# Altium footprint library standard-graphic-logo.PcbLib: 61 footprints (part 1 of 4)
Each footprint in its own frame and in the unit in brackets; x right, y up, seen from the top. Pads: shape width x height; smd on the part's side, far side on the other; paste and mask are expansions set on the pad; w line width, h text height; cw(c..) or ccw(c..) is an arc to the next point about the centre after c.
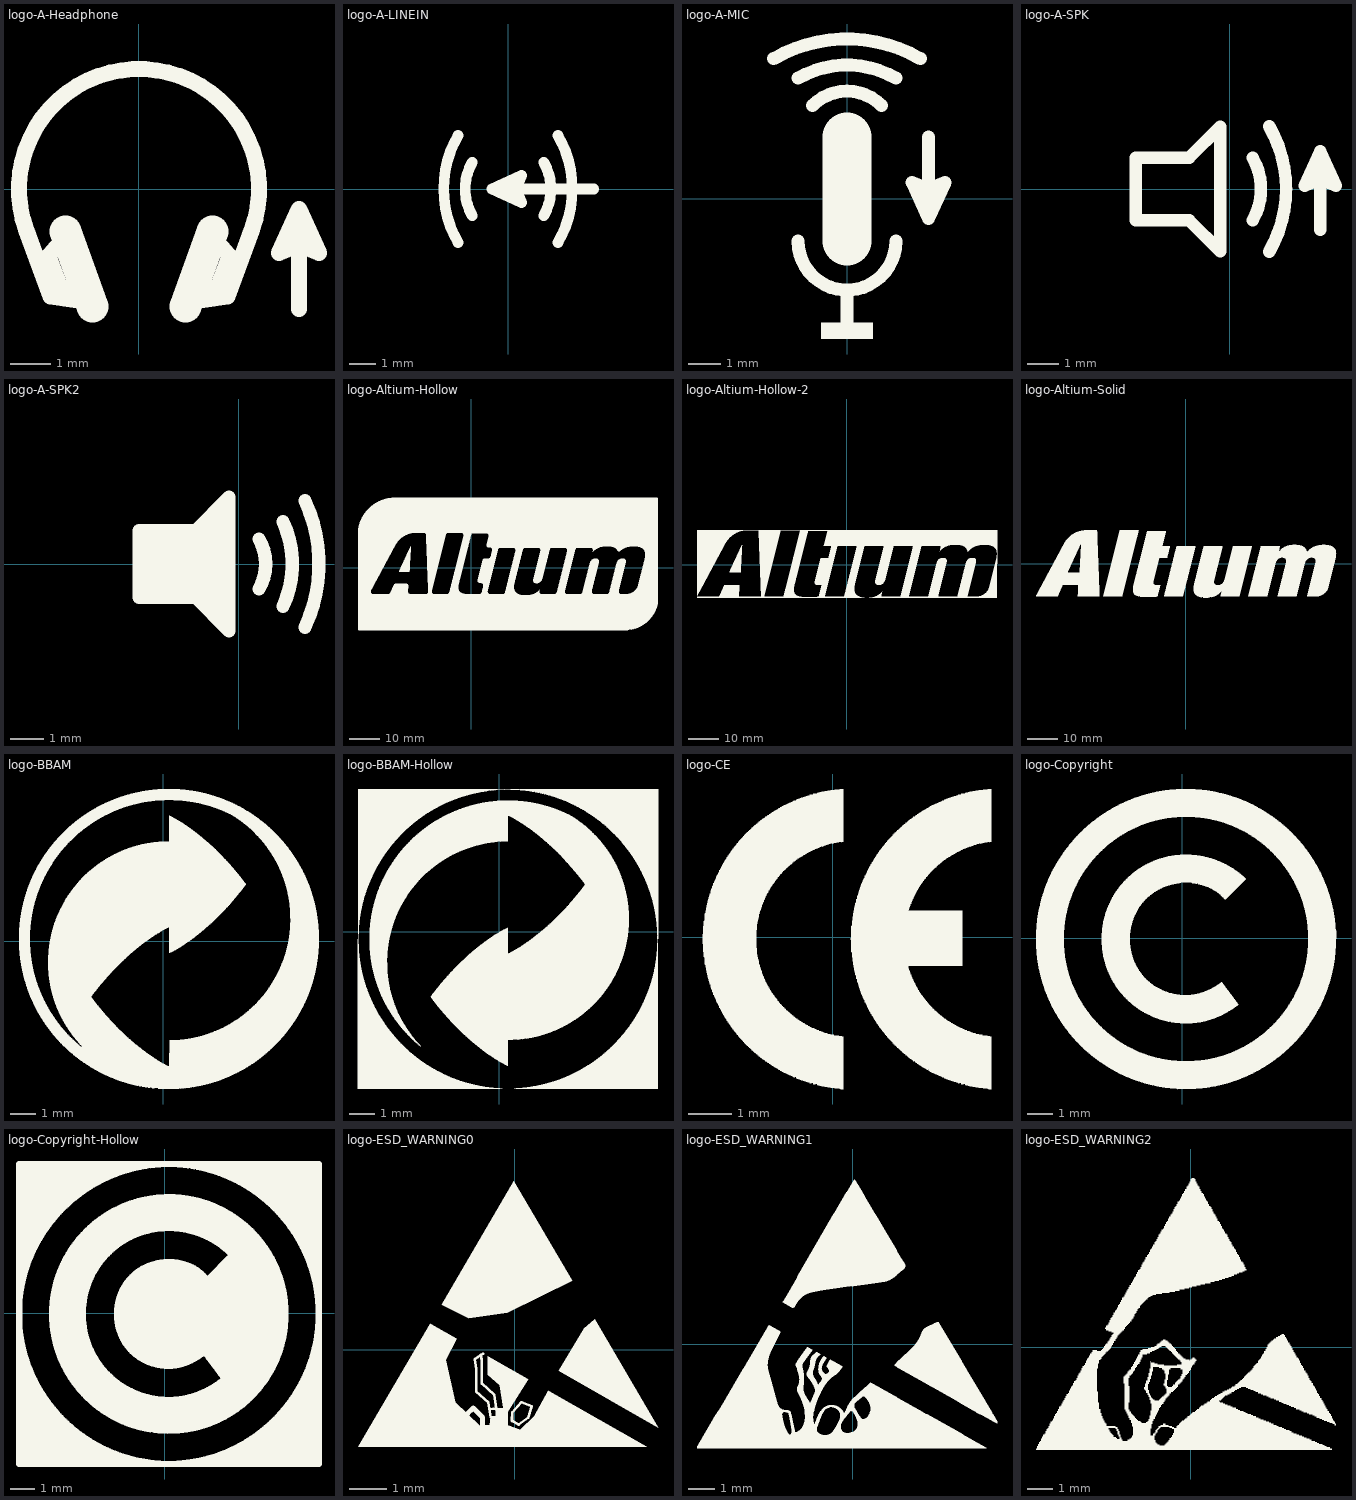
[diagram p0: the footprints below, top view; thin cyan lines are the x and y axes]

## logo-A-Headphone [mm]
Top Overlay:
  lines w0.4: -2.489,-1.934 -1.808,-1.154 ; -2.258,-1.67 -1.893,-2.675 ; -1.192,-2.846 -2.215,-2.686 -2.819,-1.026 cw(c0,0) 2.819,-1.026 2.215,-2.686 1.192,-2.846 ; 1.808,-1.154 2.489,-1.934 ; 1.893,-2.675 2.258,-1.67 ; 4,-3 4,-0.5 ; 4,-0.5 4.5,-1.6 4,-1.4 3.5,-1.6 4,-0.5
  lines w0.8: -1.842,-1.06 -1.158,-2.94 ; 1.158,-2.94 1.842,-1.06
  text "TarahiBoard.com" at 3.83,-1.417 h0.1

## logo-A-LINEIN [mm]
Top Overlay:
  lines w0.4: -1.864,-2 cw(c1.6,0) -1.864,2 ; -1.332,-1 cw(c0.4,0) -1.332,1 ; 1.332,-1 ccw(c-0.4,0) 1.332,1 ; 1.864,-2 ccw(c-1.6,0) 1.864,2 ; 3.2,0 -0.6,0 ; -0.6,0 0.5,-0.5 0.3,0 0.5,0.5 -0.6,0
  text "TarahiBoard.com" at 3.015,0.107 h0.1

## logo-A-MIC [mm]
Top Overlay:
  rectangle: -0.8,-4.3 0.8,-3.8
  lines w0.4: -2.25,4.297 cw(c0,0.4) 2.25,4.297 ; -1.5,-1.3 ccw(c0,-1.3) 1.5,-1.3 ; -1.5,3.698 cw(c0,1.1) 1.5,3.698 ; -1.061,2.861 cw(c0,1.8) 1.061,2.861 ; 0,-3.8 0,-2.8 ; 2.5,1.9 2.5,-0.6 ; 2.5,-0.6 3,0.5 2.5,0.3 2,0.5 2.5,-0.6
  lines w1.5: 0,-1.3 0,1.9
  text "TarahiBoard.com" at 0.107,-0.215 h0.1

## logo-A-SPK [mm]
Top Overlay:
  lines w0.4: 0.732,-1 ccw(c-1,0) 0.732,1 ; 1.264,-2 ccw(c-2.2,0) 1.264,2 ; 2.9,-1.3 2.9,1.2 ; 2.9,1.2 2.4,0.1 2.9,0.3 3.4,0.1 2.9,1.2 ; -3,-1 -3,1 -1.3,1 -0.3,2 -0.3,-2 -1.3,-1 -3,-1
  text "TarahiBoard.com" at -2.765,-1.107 h0.1

## logo-A-SPK2 [mm]
Top Overlay:
  region: -0.3,2 -1.3,1 -3,1 -3,-1 -1.3,-1 -0.3,-2
  lines w0.4: 0.599,-0.75 ccw(c-0.7,0) 0.599,0.75 ; 1.319,-1.268 ccw(c-1.4,0) 1.319,1.268 ; 1.978,-1.902 ccw(c-2.1,0) 1.978,1.902 ; -3,-1 -1.3,-1 -0.3,-2 -0.3,2 -1.3,1 -3,1 -3,-1
  text "TarahiBoard.com" at -2.52,0.02 h0.1

## logo-Altium-Hollow [mm]
Top Overlay:
  drawing of 2 lines, arcs and shapes, not listed
  text "TarahiBoard.com" at 35.193,14.632 h1

## logo-Altium-Hollow-2 [mm]
Top Overlay:
  drawing of 2 lines, arcs and shapes, not listed
  text "TarahiBoard.com" at 21.363,9.425 h1

## logo-Altium-Solid [mm]
Top Overlay:
  drawing of 6 lines, arcs and shapes, not listed
  text "TarahiBoard.com" at -21.998,7.253 h1

## logo-BBAM [mm]
Top Overlay:
  drawing of 1 lines, arcs and shapes, not listed

## logo-BBAM-Hollow [mm]
Top Overlay:
  drawing of 2 lines, arcs and shapes, not listed

## logo-CE [mm]
Top Overlay:
  drawing of 2 lines, arcs and shapes, not listed
  text "TarahiBoard.com" at 1.163,-0.107 h0.1

## logo-Copyright [mm]
Top Overlay:
  drawing of 2 lines, arcs and shapes, not listed

## logo-Copyright-Hollow [mm]
Top Overlay:
  drawing of 9 lines, arcs and shapes, not listed

## logo-ESD_WARNING0 [mm]
Top Overlay:
  region: -2.242,0.693 -1.543,0.298 -1.83,-0.26 -1.583,-1.393 -0.932,-2.021 -0.658,-1.996 -0.638,-1.797 -0.5,-1.784 -0.489,-1.56 -0.304,-1.542 -0.397,-0.95 -0.717,-0.666 -0.717,-0.173 0.363,-0.787 -0.18,-1.647 -0.18,-2.003 0.146,-2.133 0.523,-1.772 0.894,-1.089 3.517,-2.582 -4.164,-2.582 -2.24,0.694
  region: 1.168,-0.564 3.812,-2.07 2.125,0.815 1.849,0.568 1.173,-0.552
  region: -0.025,4.483 -1.936,1.203 -1.214,0.842 -0.196,0.984 1.527,1.834 -0.023,4.482
  lines w0.071: -0.893,-0.136 -0.871,-0.299 -0.871,-0.902 -0.542,-1.196 -0.489,-1.56 ; -0.843,-0.102 -1.058,-0.251 -1.024,-0.509 -1.024,-1.114 -0.697,-1.405 -0.638,-1.797 -0.457,-1.781 -0.489,-1.56 ; -0.672,-1.578 -0.489,-1.56 ; -0.068,-1.893 -0.061,-1.661 0.181,-1.393 0.452,-1.501 0.361,-1.802 0.112,-1.989 -0.068,-1.893
  lines w0.13: -1.257,-1.707 -1.1,-1.55 -0.85,-1.8 -0.85,-2
  text "TarahiBoard.com" at 0.909,-2.266 h0.1

## logo-ESD_WARNING1 [mm]
Top Overlay:
  drawing of 3 lines, arcs and shapes, not listed
  text "TarahiBoard.com" at -0.869,3.195 h0.1

## logo-ESD_WARNING2 [mm]
Top Overlay:
  drawing of 1 lines, arcs and shapes, not listed
  text "TarahiBoard.com" at 1.036,-3.282 h0.1